# Altium footprint library PCB-Tester-Board-V1.PcbLib: 67 footprints (part 1 of 5)
Each footprint in its own frame and in the unit in brackets; x right, y up, seen from the top. Pads: shape width x height; smd on the part's side, far side on the other; paste and mask are expansions set on the pad; w line width, h text height; cw(c..) or ccw(c..) is an arc to the next point about the centre after c.
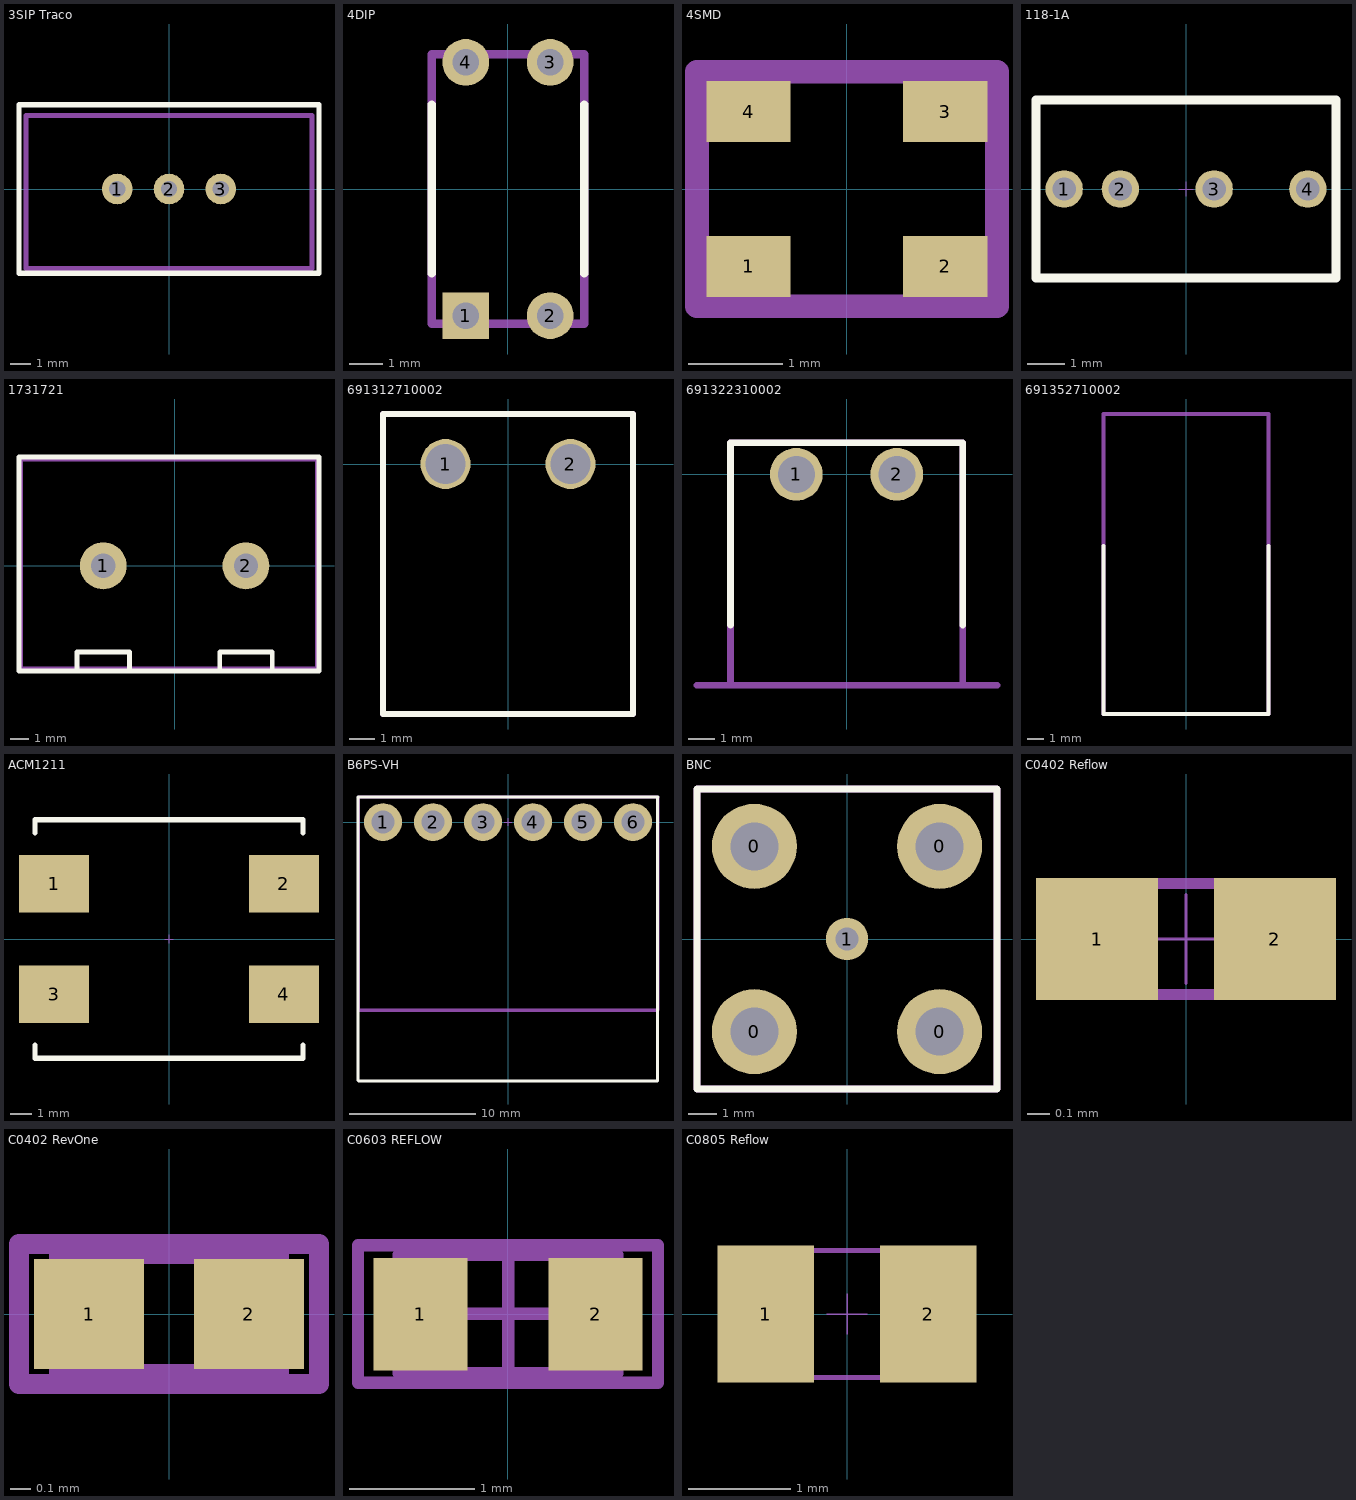
[diagram p0: the footprints below, top view; thin cyan lines are the x and y axes]

## 3SIP Traco [mm] "Traco (1951-2692-ND)"
pads (3):
  round 1.5 hole 0.8: 1(-2.54,0) 2(0,0) 3(2.54,0)
Top Overlay:
  lines w0.254: -7.35,-4.125 -7.35,4.125 7.35,4.125 7.35,-4.125 -7.35,-4.125
  text "." at -2.6,-1.6 h1
Top Courtyard:
  lines w0.254: -7,-3.9 7,-3.9 7,3.6 -7,3.6 -7,-3.9
3D body "TSR2-2405.STEP": height 10.1, standoff -4.1, extent -7,-3.9 7,3.6

## 4DIP [mm]
pads (4):
  rect 1.4x1.4 hole 0.8 paste+0: 1(-1.27,-3.81)
  round 1.4 hole 0.8 paste+0: 2(1.27,-3.81) 3(1.27,3.81) 4(-1.27,3.81)
Top Overlay:
  lines w0.254: -2.29,-2.54 -2.29,2.54 ; 2.29,-2.54 2.29,2.54
Top Courtyard:
  lines w0.254: -2.29,-4.05 2.29,-4.05 2.29,4.05 -2.29,4.05 -2.29,-4.05
3D body "G3VM_61A1.STEP": height 4.45, standoff -2.5, extent -2.29,-4.05 2.29,4.05

## 4SMD [mm]
pads (4):
  rect 0.9x0.65 smd paste+0: 1(-1.05,-0.825) 2(1.05,-0.825) 3(1.05,0.825) 4(-1.05,0.825)
Top Courtyard:
  lines w0.254: -1.6,-1.25 -1.6,1.25 1.6,1.25 1.6,-1.25 -1.6,-1.25
3D body "ASE.STEP": height 1.2, standoff 0, extent -1.6,-1.25 1.6,1.25

## 118-1A [mil] "ATE Relay (NO)"
height 610
pads (4):
  round 40 hole 25: 1(-130,0) 2(-70,0) 3(30,0) 4(130,0)
Top Overlay:
  lines w10: -160,-95 -160,95 160,95 160,-95 -160,-95
Top Courtyard:
  lines w1.97: -160.04,93.98 -160.04,-94.96 -160,-95 160,-95 160,95 -160,95
Mechanical 17:
  lines w0.51: -7.87,0 7.87,0 ; 0,-7.87 0,7.87
3D body "118-1-A.STEP": height 600, standoff -124.8, extent -160.04,-95 160.04,93.98

## 1731721 [mm] "TERM BLK 2P SIDE ENT 7.62MM PCB"
pads (2):
  round 2.5 hole 1.3: 1(-3.805,0) 2(3.805,0)
Top Overlay:
  lines w0.254: -5.2,-5.6 -5.2,-4.6 -2.4,-4.6 -2.4,-5.6 ; 2.41,-5.6 2.41,-4.6 5.21,-4.6 5.21,-5.6 ; -8.3,-5.6 7.7,-5.6 7.7,5.8 -8.3,5.8 -8.3,-5.6
  text "." at -3.905,2.1 h1.2
Top Courtyard:
  lines w0.254: -8.205,-5.5 -8.205,5.7 7.605,5.7 7.605,-5.5 -8.205,-5.5
3D body "1731721.STEP": height 18.35, standoff -4.95, extent -8.205,-5.5 7.605,5.7

## 691312710002 [mm] "TERM BLOCK HDR 2POS 90DEG 5MM"
pads (2):
  round 2 hole 1.6 paste-2: 1(-2.5,0) 2(2.5,0)
Top Overlay:
  lines w0.254: -5,-10 -5,2 5,2 5,-10 -5,-10
Top Courtyard:
  lines w0.254: -5,-10 -5,2 5,2 5,-10 -5,-10
3D body "691312710002.STEP": height 8.5, standoff -3.5, extent -5,-10 5,2

## 691322310002 [mm] "TERM BLOCK HDR 2POS 90DEG 3.81MM"
pads (2):
  round 2 hole 1.4 paste+0: 1(-1.905,0) 2(1.905,0)
Top Overlay:
  lines w0.254: -4.405,-5.715 -4.405,1.2 4.405,1.2 4.405,-5.715
Top Courtyard:
  lines w0.254: -4.405,-8 4.405,-8 4.405,1.2 -4.405,1.2 -4.405,-8
Mechanical 17:
  lines w0.254: -5.674,-8 5.705,-8
3D body "691322310002.STEP": height 7.2, standoff -3.5, extent -4.405,-8 4.405,1.2

## 691352710002 [mm] "TERM BLOCK PLUG 2POS STR 5MM"
Top Overlay:
  lines w0.254: -5,-10 -5,-20.2 5,-20.2 5,-10
Top Courtyard:
  lines w0.254: -5,-20.2 5,-20.2 5,-2 -5,-2 -5,-20.2
3D body "691352710002.STEP": height 15.15, standoff 0.05, extent -5,-20.2 5,-2

## 691361300002 [mm] "TERM BLOCK PLUG 2POS STR 3.81MM"
3D body "691361300002.STEP": height 7.7, standoff -3.4, extent -3.81,-17 3.81,-1.2

## ACM1211 [mm] "ACM1211"
pads (4):
  rect 3.3x2.7 smd: 1(-5.4,2.6) 2(5.4,2.6) 3(-5.4,-2.6) 4(5.4,-2.6)
Top Overlay:
  lines w0.254: -6.3,-5 -6.3,-5.6 6.3,-5.6 6.3,-5 ; -6.3,5 -6.3,5.6 6.3,5.6 6.3,5
  text "." at -2.6,2.4 h2
Mechanical 17:
  lines w0.013: -0.2,0 0.2,0 ; 0,-0.2 0,0.2
3D body "ACM1211.STEP": height 6, standoff 0, extent -6.15,-5.5 6.15,5.5

## B6PS-VH [mm] "CONN HEADER R/A 6POS 3.96MM"
pads (6):
  round 3 hole 1.8: 1(-9.9,0) 2(-5.94,0) 3(-1.98,0) 4(1.98,0) 5(5.94,0) 6(9.9,0)
Top Overlay:
  lines w0.254: -11.88,-20.47 -11.88,1.98 11.88,1.98 ; -11.85,-20.5 11.85,-20.5 11.85,1.95
  text "." at -9.9,-1.98 h2.54
Top Courtyard:
  lines w0.254: -11.88,1.98 -11.85,1.95 -11.85,-14.9 11.85,-14.9 11.88,-14.87 11.88,1.98 -11.88,1.98
Mechanical 17:
  lines w0.013: -0.3,0 0.3,0 ; 0,-0.3 0,0.3
3D body "B6PS-VH.STEP": height 8.5, standoff -3.6, extent -11.85,-14.9 11.85,0.57

## BNC [mm] "112778"
pads (5):
  round 3 hole 1.7: 0(-3.275,-3.275) 0(-3.275,3.275) 0(3.275,-3.275) 0(3.275,3.275)
  round 1.5 hole 0.8: 1(0,0)
Top Overlay:
  lines w0.254: -5.3,-5.3 5.3,-5.3 5.3,5.3 -4,5.3 -5.3,5.3 -5.3,-5.3
Top Courtyard:
  lines w0.254: -5.3,-5.3 -5.3,5.3 -4,5.3 5.3,5.3 5.3,-5.3 -5.3,-5.3
3D body "112778.step": height 11.64, standoff -3.34, extent -5.26,-5.25 5.26,22.64

## C0402 Reflow [mm] "SMT CAP 0402 Reflow Soldering"
pads (2):
  rect 0.55x0.55 smd: 1(-0.4,0) 2(0.4,0)
Top Solder:
  rectangle: -0.3,-0.377 0.3,0.377
Top Courtyard:
  lines w0.05: -0.5,-0.25 0.5,-0.25 0.5,0.25 -0.5,0.25 -0.5,-0.25
Mechanical 17:
  lines w0.013: -0.2,0 0.2,0 ; 0,-0.2 0,0.2
3D body "C0402.STEP": height 0.5, standoff 0, extent -0.5,-0.25 0.5,0.25

## C0402 RevOne [mm] "Chip Capacitor; Body 1.0x0.5mm (LxW typ), IPC High Density"
height 0.6
pads (2):
  rect 0.55x0.55 smd: 1(-0.4,0) 2(0.4,0)
Top Component Outline:
  lines w0.1: -0.55,-0.3 0.55,-0.3 0.55,0.3 -0.55,0.3 -0.55,-0.3
Top Courtyard:
  lines w0.1: -0.75,-0.35 -0.75,0.35 0.75,0.35 0.75,-0.35 -0.75,-0.35
3D body: height 0.6, standoff 0, extent -0.55,-0.3 0.55,0.3

## C0603 REFLOW [mm] "Chip Capacitor; Body 1.6x0.8mm (LxW typ), IPC High Density"
height 0.85
pads (2):
  rect 0.75x0.9 smd: 1(-0.7,0) 2(0.7,0)
Mechanical 13:
  lines w0.1: -0.875,-0.475 0.875,-0.475 0.875,0.475 -0.875,0.475 -0.875,-0.475
Mechanical 15:
  lines w0.1: -0.475,0 0.475,0 ; 0,-0.475 0,0.475 ; -1.2,-0.55 1.2,-0.55 1.2,0.55 -1.2,0.55 -1.2,-0.55
3D body: height 0.85, standoff 0, extent -0.875,-0.475 0.875,0.475

## C0805 Reflow [mm] "SMT Capacitor 0805 Reflow Soldering"
pads (2):
  rect 0.95x1.35 smd: 1(-0.8,0) 2(0.8,0)
Top Courtyard:
  lines w0.05: -1,-0.625 1,-0.625 1,0.625 -1,0.625 -1,-0.625
Mechanical 17:
  lines w0.013: -0.2,0 0.2,0 ; 0,-0.2 0,0.2
3D body "C0805.STEP": height 0.6, standoff 0, extent -1,-0.625 1,0.625